# Altium footprint library PcbLib.PcbLib: 428 footprints (part 27 of 27)
Each footprint in its own frame and in the unit in brackets; x right, y up, seen from the top. Pads: shape width x height; smd on the part's side, far side on the other; paste and mask are expansions set on the pad; w line width, h text height; cw(c..) or ccw(c..) is an arc to the next point about the centre after c.
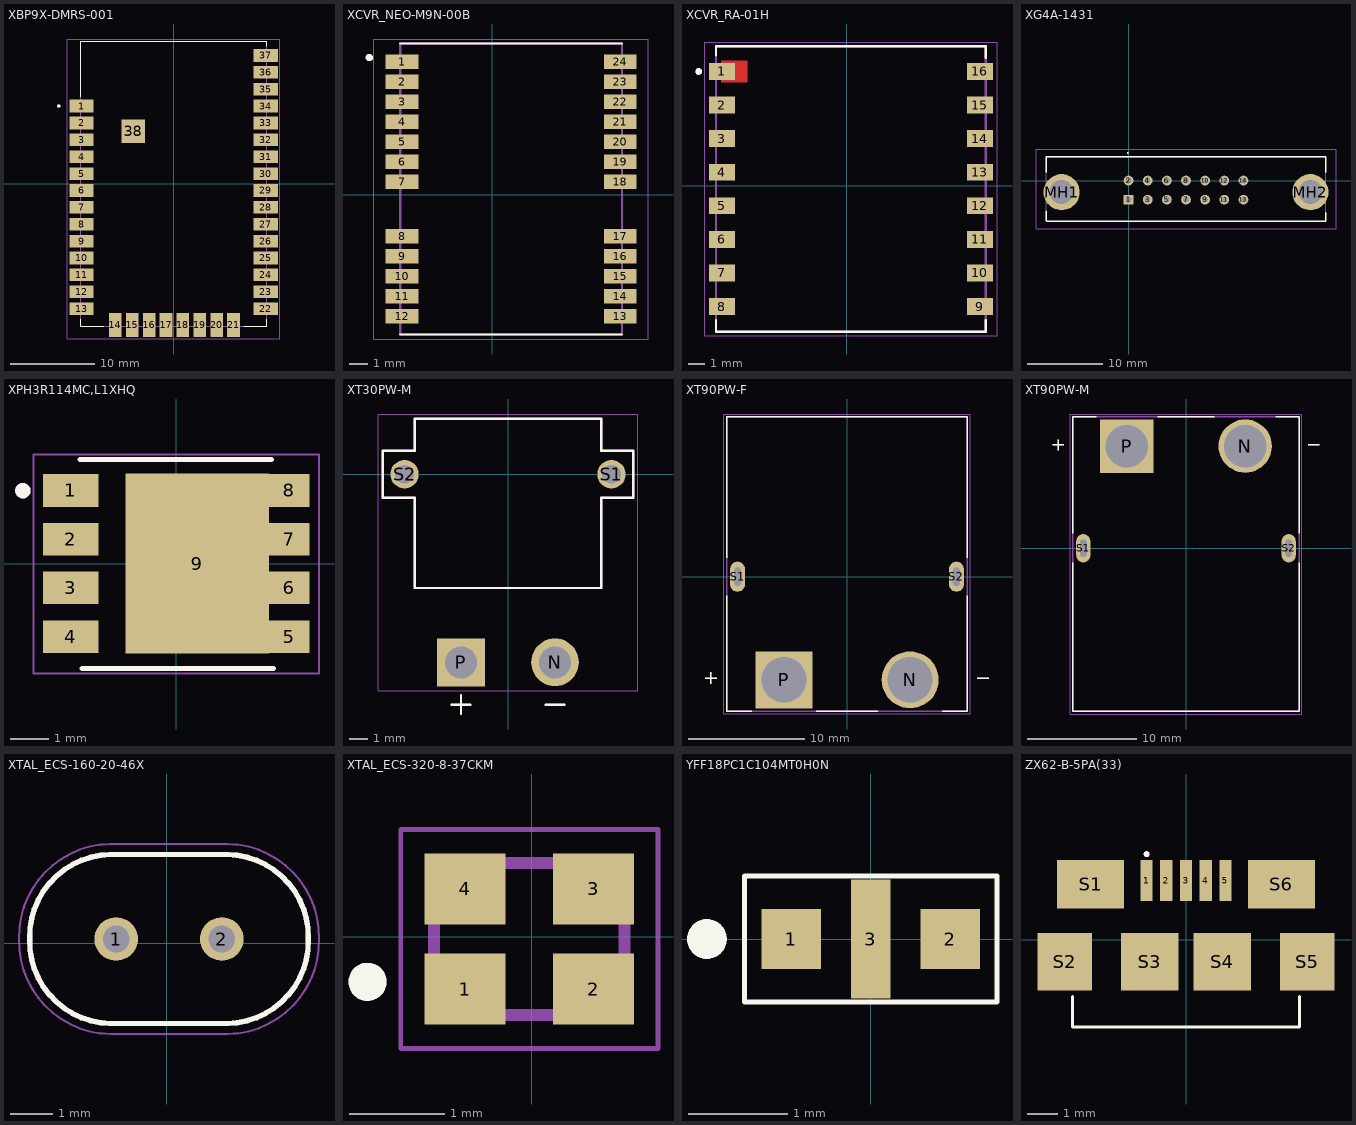
[diagram p26: the footprints below, top view; thin cyan lines are the x and y axes]

## XBP9X-DMRS-001 [mm]
pads (38):
  rect 2.86x1.5 smd: 1(-10.91,9.195) 2(-10.91,7.195) 3(-10.91,5.195) 4(-10.91,3.195) 5(-10.91,1.195) 6(-10.91,-0.805) 7(-10.91,-2.805) 8(-10.91,-4.805) 9(-10.91,-6.805) 10(-10.91,-8.805) 11(-10.91,-10.805) 12(-10.91,-12.805) 13(-10.91,-14.805) 22(10.91,-14.805) 23(10.91,-12.805) 24(10.91,-10.805) 25(10.91,-8.805) 26(10.91,-6.805) 27(10.91,-4.805) 28(10.91,-2.805) 29(10.91,-0.805) 30(10.91,1.195) 31(10.91,3.195) 32(10.91,5.195) 33(10.91,7.195) 34(10.91,9.195) 35(10.91,11.195) 36(10.91,13.195) 37(10.91,15.195)
  rect 1.5x2.86 smd: 14(-6.912,-16.725) 15(-4.912,-16.725) 16(-2.912,-16.725) 17(-0.912,-16.725) 18(1.088,-16.725) 19(3.088,-16.725) 20(5.088,-16.725) 21(7.088,-16.725)
  rect 2.794x2.794 smd paste-0.412: 38(-4.814,6.223)
Top Overlay:
  circle w0.2: c-13.61,9.195 r0.1
  lines w0.127: -11.034,-16.055 -11.034,-16.891 -8.3,-16.891 ; -11.034,10.3 -11.034,16.891 11.034,16.891 11.034,16.3 ; 8.3,-16.891 11.034,-16.891 11.034,-16.055
Mechanical 13:
  circle w0.2: c-13.61,9.195 r0.1
  lines w0.127: -11.034,-16.891 -11.034,16.891 11.034,16.891 11.034,-16.891 -11.034,-16.891
Mechanical 15:
  lines w0.05: -12.59,-18.405 12.59,-18.405 12.59,17.141 -12.59,17.141 -12.59,-18.405
3D body: height 2.7, standoff 0.1, extent -11.034,-16.891 11.034,16.891

## XCVR_NEO-M9N-00B [mm]
pads (24):
  rect 1.8x0.8 smd paste-2: 1(-4.959,7.305) 2(-4.959,6.205) 3(-4.959,5.105) 4(-4.959,4.005) 5(-4.959,2.905) 6(-4.959,1.805) 7(-4.959,0.705) 8(-4.959,-2.295) 9(-4.959,-3.395) 10(-4.959,-4.495) 11(-4.959,-5.595) 12(-4.959,-6.695) 13(7.041,-6.695) 14(7.041,-5.595) 15(7.041,-4.495) 16(7.041,-3.395) 17(7.041,-2.295) 18(7.041,0.705) 19(7.041,1.805) 20(7.041,2.905) 21(7.041,4.005) 22(7.041,5.105) 23(7.041,6.205) 24(7.041,7.305)
Top Overlay:
  circle w0.2: c-6.759,7.535 r0.1
  lines w0.127: -5.059,-7.695 7.141,-7.695 ; -5.059,8.305 7.141,8.305
Top Paste:
  drawing of 24 lines, arcs and shapes, not listed
Mechanical 13:
  circle w0.2: c-6.759,7.535 r0.1
  lines w0.127: -5.059,-7.695 7.141,-7.695 7.141,8.305 -5.059,8.305 -5.059,-7.695
Mechanical 15:
  lines w0.05: -6.509,-7.945 8.591,-7.945 8.591,8.555 -6.509,8.555 -6.509,-7.945
3D body "step_temp.STEP": height 2.6, standoff 0, extent -5.059,-7.695 7.141,8.305

## XCVR_RA-01H [mm]
pads (16):
  rect 1.536x1 smd paste-2 mask+0: 1(-7.428,6.797)
  rect 1.536x1 smd: 2(-7.428,4.797) 3(-7.428,2.797) 4(-7.428,0.797) 5(-7.428,-1.203) 6(-7.428,-3.203) 7(-7.428,-5.203) 8(-7.428,-7.203) 9(7.936,-7.203) 10(7.936,-5.203) 11(7.936,-3.203) 12(7.936,-1.203) 13(7.936,0.797) 14(7.936,2.797) 15(7.936,4.797) 16(7.936,6.797)
Top Layer:
  region: -5.934,6.162 -7.47,6.162 -7.47,6.297 -8.196,6.297 -8.196,7.297 -7.47,7.297 -7.47,7.432 -5.934,7.432
Top Overlay:
  circle w0.2: c-8.815,6.797 r0.1
  lines w0.127: -7.777,-8.023 -7.777,-8.703 8.285,-8.703 8.285,-8.023 ; -7.777,7.752 -7.777,8.297 8.285,8.297 8.285,7.617
Top Paste:
  region: -5.934,6.162 -7.47,6.162 -7.47,6.297 -8.196,6.297 -8.196,7.297 -7.47,7.297 -7.47,7.432 -5.934,7.432
Top Solder:
  region: -5.834,6.062 -7.57,6.062 -7.57,6.197 -8.296,6.197 -8.296,7.397 -7.57,7.397 -7.57,7.532 -5.834,7.532
Mechanical 13:
  circle w0.2: c-8.815,6.797 r0.1
  lines w0.127: -7.777,-8.703 8.285,-8.703 8.285,8.297 -7.777,8.297 -7.777,-8.703
Mechanical 15:
  lines w0.05: -8.446,-8.953 -8.446,8.547 8.954,8.547 8.954,-8.953 -8.446,-8.953
3D body "step_temp.STEP": height 3.4, standoff 0, extent -7.746,-8.703 8.254,8.297

## XG4A-1431 [mm]
pads (16):
  rect 1.3x1.3 hole 0.8: 1(0,-2.54)
  round 1.3 hole 0.8: 2(0,0) 3(2.54,-2.54) 4(2.54,0) 5(5.08,-2.54) 6(5.08,0) 7(7.62,-2.54) 8(7.62,0) 9(10.16,-2.54) 10(10.16,0) 11(12.7,-2.54) 12(12.7,0) 13(15.24,-2.54) 14(15.24,0)
  round 4.8 hole 3.2: MH1(-8.88,-1.54) MH2(24.12,-1.54)
Top Overlay:
  lines w0.1: -0.1,3.6 ccw(c-0.1,3.65) -0.1,3.7 ccw(c-0.1,3.65) -0.1,3.6
  lines w0.2: -10.93,-4.47 -10.93,-4.07 ; -10.93,-4.27 -10.93,-5.27 -10.88,-5.37 26.17,-5.37 26.17,-4.27 ; -10.93,1.13 -10.93,1.73 -10.93,3.13 26.17,3.13 26.17,1.73 26.17,1.13
Mechanical 13:
  lines w0.1: -10.93,-5.37 26.17,-5.37 26.17,3.13 -10.93,3.13 -10.93,-5.37
Mechanical 15:
  lines w0.1: -12.28,-6.37 27.52,-6.37 27.52,4.13 -12.28,4.13 -12.28,-6.37
3D body "XG4A-1431--3DModel-STEP-273799.STEP": height 27, standoff -3.2, extent -10.854,-5.345 26.246,3.155

## XPH3R114MC,L1XHQ [mm]
pads (9):
  rect 1.45x0.85 smd: 1(-2.75,1.905) 2(-2.75,0.635) 3(-2.75,-0.635) 4(-2.75,-1.905)
  rect 1.05x0.85 smd: 5(2.95,-1.905) 6(2.95,-0.635) 7(2.95,0.635) 8(2.95,1.905)
  rect 3.75x4.7 smd paste-3: 9(0.55,0)
Top Overlay:
  circle w0.2: c-4,1.9 r0.1
  lines w0.127: -2.515,2.718 2.485,2.718 ; -2.46,-2.743 2.54,-2.743
Top Paste:
  region: 2.04,-1.186 -0.94,-1.186 -0.94,1.186 2.04,1.186
Mechanical 13:
  circle w0.2: c-4,1.9 r0.1
Mechanical 15:
  lines w0.05: -3.725,-2.87 -3.725,2.845 3.725,2.845 3.725,-2.87 -3.725,-2.87
3D body "TPHR8504PL,L1Q.STEP": height 1, standoff 0, extent -2.924,-2.675 3.076,2.625

## XT30PW-M [mm]
height 5
pads (4):
  round 2.54 hole 1.7: N(2.5,-10)
  rect 2.55x2.55 hole 1.7: P(-2.5,-10)
  round 1.508 hole 1: S1(5.5,0) S2(-5.5,0)
Top Overlay:
  lines w0.127: -3,-12.25 -2,-12.25 ; -2.5,-12.75 -2.5,-11.75 ; 2,-12.25 3,-12.25 ; -6.65,-1.25 -4.95,-1.25 -4.95,-6.05 4.95,-6.05 4.95,-1.25 6.65,-1.25 6.65,1.25 4.95,1.25 4.95,2.95 -4.95,2.95 -4.95,1.25 -6.65,1.25 -6.65,-1.25
Mechanical 13:
  lines w0.127: -3,-12.25 -2,-12.25 ; -2.5,-12.75 -2.5,-11.75 ; 2,-12.25 3,-12.25 ; -6.65,-1.25 -4.95,-1.25 -4.95,-6.05 4.95,-6.05 4.95,-1.25 6.65,-1.25 6.65,1.25 4.95,1.25 4.95,2.95 -4.95,2.95 -4.95,1.25 -6.65,1.25 -6.65,-1.25
Mechanical 15:
  lines w0.05: -6.9,-11.525 -6.9,3.2 6.9,3.2 6.9,-11.525 -6.9,-11.525
3D body "XT30PW.stp": height 5.1, standoff -1.9, extent -6.65,-11.01 6.65,2.94

## XT90PW-F [mm] "AMASS"
pads (4):
  round 4.916 hole 3.9: N(5.45,-8.9)
  rect 4.916x4.916 hole 3.9: P(-5.45,-8.9)
  oval 1.3x2.6 hole 0.6 slot 1.6 at 90 deg: S1(-9.45,0) S2(9.45,0)
Top Overlay:
  lines w0.127: -12.25,-8.75 -11.25,-8.75 ; -11.75,-9.25 -11.75,-8.25 ; -10.4,-1.62 -10.4,-11.6 -8.228,-11.6 ; -10.4,1.62 -10.4,13.8 10.4,13.8 10.4,1.62 ; -2.672,-11.6 2.672,-11.6 ; 8.228,-11.6 10.4,-11.6 10.4,-1.62 ; 11.25,-8.75 12.25,-8.75
Mechanical 13:
  lines w0.127: -12.25,-8.75 -11.25,-8.75 ; -11.75,-9.25 -11.75,-8.25 ; 11.25,-8.75 12.25,-8.75 ; -10.4,-11.6 -10.4,13.8 10.4,13.8 10.4,-11.6 -10.4,-11.6
Mechanical 15:
  lines w0.05: -10.65,-11.85 10.65,-11.85 10.65,14.05 -10.65,14.05 -10.65,-11.85
3D body "step_temp.STEP": height 10.3, standoff -3.2, extent -10.75,-11.6 10.75,13.8

## XT90PW-M [mm] "AMASS"
pads (4):
  round 4.916 hole 3.9: N(5.45,9.4)
  rect 4.916x4.916 hole 3.9: P(-5.45,9.4)
  oval 1.3x2.6 hole 0.6 slot 1.6 at 90 deg: S1(-9.45,0) S2(9.45,0)
Top Overlay:
  lines w0.127: -12.25,9.5 -11.25,9.5 ; -11.75,9 -11.75,10 ; -10.4,-1.35 -10.4,-15 10.4,-15 10.4,-1.35 ; -10.4,1.4 -10.4,12.1 -8.25,12.1 ; -2.6,12.1 2.6,12.1 ; 8.25,12.1 10.4,12.1 10.4,1.4 ; 11.25,9.5 12.25,9.5
Mechanical 13:
  lines w0.127: -12.25,9.5 -11.25,9.5 ; -11.75,9 -11.75,10 ; 11.25,9.5 12.25,9.5 ; -10.4,-15 -10.4,12.1 10.4,12.1 10.4,-15 -10.4,-15
Mechanical 15:
  lines w0.05: -10.65,-15.25 -10.65,12.35 10.65,12.35 10.65,-15.25 -10.65,-15.25
3D body "step_temp.STEP": height 10.3, standoff -3.2, extent -10.6,-15 10.6,12.1

## XTAL_ECS-160-20-46X [mm]
pads (2):
  round 1.03 hole 0.63: 1(-1.199,0.102) 2(1.301,0.102)
Top Overlay:
  lines w0.127: -3.25,0.086 ccw(c-1.299,0.052) -1.333,-1.899 ; -3.25,0.118 cw(c-1.299,0.152) -1.333,2.102 ; -1.349,-1.898 1.451,-1.898 ; -1.349,2.102 1.451,2.102 ; 1.435,-1.899 ccw(c1.401,0.052) 3.351,0.086 ; 1.435,2.102 cw(c1.401,0.152) 3.351,0.118
Mechanical 13:
  lines w0.127: -3.25,0.086 ccw(c-1.299,0.052) -1.333,-1.899 ; -3.25,0.118 cw(c-1.299,0.152) -1.333,2.102 ; -1.349,-1.898 1.451,-1.898 ; -1.349,2.102 1.451,2.102 ; 1.435,-1.899 ccw(c1.401,0.052) 3.351,0.086 ; 1.435,2.102 cw(c1.401,0.152) 3.351,0.118
Mechanical 15:
  lines w0.05: -3.499,0.09 ccw(c-1.299,0.052) -1.338,-2.149 ; -3.499,0.113 cw(c-1.299,0.152) -1.338,2.352 ; -1.349,-2.148 1.451,-2.148 ; -1.349,2.352 1.451,2.352 ; 1.439,-2.149 ccw(c1.401,0.052) 3.601,0.09 ; 1.439,2.352 cw(c1.401,0.152) 3.601,0.113
3D body "step_temp.STEP": height 1.8, standoff -7.5, extent -3.349,-1.898 3.451,2.102

## XTAL_ECS-320-8-37CKM [mm]
pads (4):
  rect 0.85x0.75 smd: 1(-0.7,-0.55) 2(0.65,-0.55) 3(0.65,0.5) 4(-0.7,0.5)
Top Overlay:
  circle w0.2: c-1.725,-0.475 r0.1
Mechanical 13:
  circle w0.2: c-1.725,-0.475 r0.1
  lines w0.127: -1.025,-0.825 0.975,-0.825 0.975,0.775 -1.025,0.775 -1.025,-0.825
Mechanical 15:
  lines w0.05: -1.375,-1.175 1.325,-1.175 1.325,1.125 -1.375,1.125 -1.375,-1.175
3D body "step_temp.STEP": height 0.55, standoff 0, extent -1.025,-0.825 0.975,0.775

## YFF18PC1C104MT0H0N [mm]
height 0.7
pads (3):
  rect 0.6x0.6 smd: 1(-0.8,0) 2(0.8,0)
  rect 0.4x1.2 smd paste-2 mask+0: 3(0,0)
Top Overlay:
  circle w0.2: c-1.65,0 r0.1
  lines w0.05: -1.27,-0.635 1.27,-0.635 1.27,0.635 -1.27,0.635 -1.27,-0.635
Top Paste:
  region: 0.2,0.2 -0.2,0.2 -0.2,0.6 0.2,0.6
  region: 0.2,-0.6 -0.2,-0.6 -0.2,-0.2 0.2,-0.2
Top Solder:
  region: 0.201,0.2 -0.203,0.2 -0.203,0.605 0.201,0.605
  region: 0.201,-0.601 -0.203,-0.601 -0.203,-0.196 0.201,-0.196
Mechanical 13:
  circle w0.2: c-1.65,0 r0.1
3D body "FEED_4MT0H0N_TDK.step": height 0.71, standoff 0, extent -0.908,-0.438 0.896,0.45

## ZX62-B-5PA(33) [mm]
pads (11):
  rect 0.4x1.35 smd: 1(-1.3,1.95) 2(-0.65,1.95) 3(0,1.95) 4(0.65,1.95) 5(1.3,1.95)
  rect 2.2x1.6 smd: S1(-3.15,1.825) S6(3.15,1.825)
  rect 1.8x1.9 smd: S2(-4,-0.725) S5(4,-0.725)
  rect 1.9x1.9 smd: S3(-1.2,-0.725) S4(1.2,-0.725)
Top Overlay:
  lines w0.1: -3.75,-1.875 -3.75,-2.875 3.75,-2.875 3.75,-1.875 ; -1.35,2.825 cw(c-1.3,2.825) -1.25,2.825 cw(c-1.3,2.825) -1.35,2.825
3D body "step_temp.STEP": height 2.81, standoff -0.14, extent -4.037,-3.429 4.037,2.171